# Altium footprint library Connector_Samtec_HLE_SMD.PcbLib: 290 footprints (part 9 of 24) (continued)
## Samtec_HLE-125-02-xxx-DV-BE-A_2x25_P2.54mm_Horizontal [mm]
pads (102):
  rect 1.27x1.68 smd: 1(-30.48,2.72) 2(-30.48,-2.72) 3(-27.94,2.72) 4(-27.94,-2.72) 5(-25.4,2.72) 6(-25.4,-2.72) 7(-22.86,2.72) 8(-22.86,-2.72) 9(-20.32,2.72) 10(-20.32,-2.72) 11(-17.78,2.72) 12(-17.78,-2.72) 13(-15.24,2.72) 14(-15.24,-2.72) 15(-12.7,2.72) 16(-12.7,-2.72) 17(-10.16,2.72) 18(-10.16,-2.72) 19(-7.62,2.72) 20(-7.62,-2.72) 21(-5.08,2.72) 22(-5.08,-2.72) 23(-2.54,2.72) 24(-2.54,-2.72) 25(0,2.72) 26(0,-2.72) 27(2.54,2.72) 28(2.54,-2.72) 29(5.08,2.72) 30(5.08,-2.72) 31(7.62,2.72) 32(7.62,-2.72) 33(10.16,2.72) 34(10.16,-2.72) 35(12.7,2.72) 36(12.7,-2.72) 37(15.24,2.72) 38(15.24,-2.72) 39(17.78,2.72) 40(17.78,-2.72) 41(20.32,2.72) 42(20.32,-2.72) 43(22.86,2.72) 44(22.86,-2.72) 45(25.4,2.72) 46(25.4,-2.72) 47(27.94,2.72) 48(27.94,-2.72) 49(30.48,2.72) 50(30.48,-2.72)
  round 0.97 hole 0.97: Un1(27.94,-1.27) Un2(-25.4,-1.27) Un3(17.78,-1.27) Un4(-25.4,1.27) Un5(-10.16,1.27) Un6(30.48,1.27) Un7(27.94,1.27) Un8(-20.32,1.27) Un9(-12.7,-1.27) Un10(-5.08,1.27) Un12(2.54,-1.27) Un13(7.62,1.27) Un14(-17.78,-1.27) Un15(22.86,-1.27) Un16(30.48,-1.27) Un17(22.86,1.27) Un18(-2.54,1.27) Un19(20.32,1.27) Un20(12.7,1.27) Un22(0,1.27) Un23(-10.16,-1.27) Un24(-7.62,1.27) Un25(-12.7,1.27) Un26(10.16,1.27) Un27(-7.62,-1.27) Un28(5.08,1.27) Un29(-22.86,1.27) Un30(-5.08,-1.27) Un31(-15.24,-1.27) Un32(-27.94,1.27) Un33(25.4,-1.27) Un34(-20.32,-1.27) Un35(15.24,1.27) Un36(15.24,-1.27) Un37(20.32,-1.27) Un38(-27.94,-1.27) Un39(-2.54,-1.27) Un40(-30.48,-1.27) Un41(25.4,1.27) Un42(5.08,-1.27) Un43(-15.24,1.27) Un44(2.54,1.27) Un45(10.16,-1.27) Un46(17.78,1.27) Un47(0,-1.27) Un48(12.7,-1.27) Un49(-30.48,1.27) Un50(7.62,-1.27) Un51(-22.86,-1.27) Un52(-17.78,1.27)
  round 1.78 hole 1.78: Un11(-29.21,0) Un21(29.21,0)
F.SilkS:
  lines w0.12: -31.375,-2.65 -31.86,-2.65 -31.86,2.65 -31.375,2.65 -31.375,3.56 ; -29.585,-2.65 -28.835,-2.65 ; -29.585,2.65 -28.835,2.65 ; -27.045,-2.65 -26.295,-2.65 ; -27.045,2.65 -26.295,2.65 ; -24.505,-2.65 -23.755,-2.65 ; -24.505,2.65 -23.755,2.65 ; -21.965,-2.65 -21.215,-2.65 ; -21.965,2.65 -21.215,2.65 ; -19.425,-2.65 -18.675,-2.65 ; -19.425,2.65 -18.675,2.65 ; -16.885,-2.65 -16.135,-2.65 ; -16.885,2.65 -16.135,2.65 ; -14.345,-2.65 -13.595,-2.65 ; -14.345,2.65 -13.595,2.65 ; -11.805,-2.65 -11.055,-2.65 ; -11.805,2.65 -11.055,2.65 ; -9.265,-2.65 -8.515,-2.65 ; -9.265,2.65 -8.515,2.65 ; -6.725,-2.65 -5.975,-2.65 ; -6.725,2.65 -5.975,2.65 ; -4.185,-2.65 -3.435,-2.65 ; -4.185,2.65 -3.435,2.65 ; -1.645,-2.65 -0.895,-2.65 ; -1.645,2.65 -0.895,2.65 ; 0.895,-2.65 1.645,-2.65 ; 0.895,2.65 1.645,2.65 ; 3.435,-2.65 4.185,-2.65 ; 3.435,2.65 4.185,2.65 ; 5.975,-2.65 6.725,-2.65 ; 5.975,2.65 6.725,2.65 ; 8.515,-2.65 9.265,-2.65 ; 8.515,2.65 9.265,2.65 ; 11.055,-2.65 11.805,-2.65 ; 11.055,2.65 11.805,2.65 ; 13.595,-2.65 14.345,-2.65 ; 13.595,2.65 14.345,2.65 ; 16.135,-2.65 16.885,-2.65 ; 16.135,2.65 16.885,2.65 ; 18.675,-2.65 19.425,-2.65 ; 18.675,2.65 19.425,2.65 ; 21.215,-2.65 21.965,-2.65 ; 21.215,2.65 21.965,2.65 ; 23.755,-2.65 24.505,-2.65 ; 23.755,2.65 24.505,2.65 ; 26.295,-2.65 27.045,-2.65 ; 26.295,2.65 27.045,2.65 ; 28.835,-2.65 29.585,-2.65 ; 28.835,2.65 29.585,2.65 ; 31.375,-2.65 31.86,-2.65 31.86,2.65 31.375,2.65
F.CrtYd:
  lines w0.05: -32.25,-4.06 -32.25,4.06 32.25,4.06 32.25,-4.06 -32.25,-4.06
F.Fab:
  lines w0.1: -30.98,2.54 -30.48,1.833 -29.98,2.54 ; -31.75,-2.54 31.75,-2.54 31.75,2.54 -31.75,2.54 -31.75,-2.54
  text "'.Designator'" at -4.047,-2.68 h1

## Samtec_HLE-125-02-xxx-DV-BE-LC_2x25_P2.54mm_Horizontal [mm]
pads (102):
  rect 1.27x1.68 smd: 1(-30.48,2.72) 2(-30.48,-2.72) 3(-27.94,2.72) 4(-27.94,-2.72) 5(-25.4,2.72) 6(-25.4,-2.72) 7(-22.86,2.72) 8(-22.86,-2.72) 9(-20.32,2.72) 10(-20.32,-2.72) 11(-17.78,2.72) 12(-17.78,-2.72) 13(-15.24,2.72) 14(-15.24,-2.72) 15(-12.7,2.72) 16(-12.7,-2.72) 17(-10.16,2.72) 18(-10.16,-2.72) 19(-7.62,2.72) 20(-7.62,-2.72) 21(-5.08,2.72) 22(-5.08,-2.72) 23(-2.54,2.72) 24(-2.54,-2.72) 25(0,2.72) 26(0,-2.72) 27(2.54,2.72) 28(2.54,-2.72) 29(5.08,2.72) 30(5.08,-2.72) 31(7.62,2.72) 32(7.62,-2.72) 33(10.16,2.72) 34(10.16,-2.72) 35(12.7,2.72) 36(12.7,-2.72) 37(15.24,2.72) 38(15.24,-2.72) 39(17.78,2.72) 40(17.78,-2.72) 41(20.32,2.72) 42(20.32,-2.72) 43(22.86,2.72) 44(22.86,-2.72) 45(25.4,2.72) 46(25.4,-2.72) 47(27.94,2.72) 48(27.94,-2.72) 49(30.48,2.72) 50(30.48,-2.72)
  round 0.97 hole 0.97: Un1(2.54,1.27) Un2(-20.32,-1.27) Un3(10.16,1.27) Un4(2.54,-1.27) Un5(5.08,-1.27) Un6(-7.62,1.27) Un7(-25.4,1.27) Un8(-17.78,-1.27) Un9(7.62,-1.27) Un10(5.08,1.27) Un11(-10.16,1.27) Un12(-5.08,1.27) Un13(22.86,1.27) Un14(-27.94,1.27) Un15(15.24,1.27) Un17(25.4,1.27) Un18(-25.4,-1.27) Un19(-30.48,1.27) Un20(-15.24,-1.27) Un21(17.78,1.27) Un22(-27.94,-1.27) Un23(10.16,-1.27) Un24(-2.54,-1.27) Un25(-12.7,-1.27) Un26(0,-1.27) Un27(25.4,-1.27) Un28(12.7,1.27) Un29(30.48,-1.27) Un30(20.32,-1.27) Un31(-5.08,-1.27) Un32(-12.7,1.27) Un33(-30.48,-1.27) Un34(27.94,1.27) Un35(20.32,1.27) Un36(-10.16,-1.27) Un37(-7.62,-1.27) Un38(15.24,-1.27) Un40(-22.86,-1.27) Un41(22.86,-1.27) Un42(-17.78,1.27) Un43(30.48,1.27) Un44(12.7,-1.27) Un45(0,1.27) Un46(-20.32,1.27) Un47(-15.24,1.27) Un48(27.94,-1.27) Un49(-2.54,1.27) Un50(17.78,-1.27) Un51(7.62,1.27) Un52(-22.86,1.27)
  round 1.19 hole 1.19: Un16(-29.21,0) Un39(29.21,0)
F.SilkS:
  lines w0.12: -31.375,-2.65 -31.86,-2.65 -31.86,2.65 -31.375,2.65 -31.375,3.56 ; -29.585,-2.65 -28.835,-2.65 ; -29.585,2.65 -28.835,2.65 ; -27.045,-2.65 -26.295,-2.65 ; -27.045,2.65 -26.295,2.65 ; -24.505,-2.65 -23.755,-2.65 ; -24.505,2.65 -23.755,2.65 ; -21.965,-2.65 -21.215,-2.65 ; -21.965,2.65 -21.215,2.65 ; -19.425,-2.65 -18.675,-2.65 ; -19.425,2.65 -18.675,2.65 ; -16.885,-2.65 -16.135,-2.65 ; -16.885,2.65 -16.135,2.65 ; -14.345,-2.65 -13.595,-2.65 ; -14.345,2.65 -13.595,2.65 ; -11.805,-2.65 -11.055,-2.65 ; -11.805,2.65 -11.055,2.65 ; -9.265,-2.65 -8.515,-2.65 ; -9.265,2.65 -8.515,2.65 ; -6.725,-2.65 -5.975,-2.65 ; -6.725,2.65 -5.975,2.65 ; -4.185,-2.65 -3.435,-2.65 ; -4.185,2.65 -3.435,2.65 ; -1.645,-2.65 -0.895,-2.65 ; -1.645,2.65 -0.895,2.65 ; 0.895,-2.65 1.645,-2.65 ; 0.895,2.65 1.645,2.65 ; 3.435,-2.65 4.185,-2.65 ; 3.435,2.65 4.185,2.65 ; 5.975,-2.65 6.725,-2.65 ; 5.975,2.65 6.725,2.65 ; 8.515,-2.65 9.265,-2.65 ; 8.515,2.65 9.265,2.65 ; 11.055,-2.65 11.805,-2.65 ; 11.055,2.65 11.805,2.65 ; 13.595,-2.65 14.345,-2.65 ; 13.595,2.65 14.345,2.65 ; 16.135,-2.65 16.885,-2.65 ; 16.135,2.65 16.885,2.65 ; 18.675,-2.65 19.425,-2.65 ; 18.675,2.65 19.425,2.65 ; 21.215,-2.65 21.965,-2.65 ; 21.215,2.65 21.965,2.65 ; 23.755,-2.65 24.505,-2.65 ; 23.755,2.65 24.505,2.65 ; 26.295,-2.65 27.045,-2.65 ; 26.295,2.65 27.045,2.65 ; 28.835,-2.65 29.585,-2.65 ; 28.835,2.65 29.585,2.65 ; 31.375,-2.65 31.86,-2.65 31.86,2.65 31.375,2.65
F.CrtYd:
  lines w0.05: -32.25,-4.06 32.25,-4.06 32.25,4.06 -32.25,4.06 -32.25,-4.06
F.Fab:
  lines w0.1: -30.98,2.54 -30.48,1.833 -29.98,2.54 ; -31.75,-2.54 31.75,-2.54 31.75,2.54 -31.75,2.54 -31.75,-2.54
  text "'.Designator'" at -4.047,-2.68 h1

## Samtec_HLE-125-02-xxx-DV-BE_2x25_P2.54mm_Horizontal [mm]
pads (100):
  rect 1.27x1.68 smd: 1(-30.48,2.72) 2(-30.48,-2.72) 3(-27.94,2.72) 4(-27.94,-2.72) 5(-25.4,2.72) 6(-25.4,-2.72) 7(-22.86,2.72) 8(-22.86,-2.72) 9(-20.32,2.72) 10(-20.32,-2.72) 11(-17.78,2.72) 12(-17.78,-2.72) 13(-15.24,2.72) 14(-15.24,-2.72) 15(-12.7,2.72) 16(-12.7,-2.72) 17(-10.16,2.72) 18(-10.16,-2.72) 19(-7.62,2.72) 20(-7.62,-2.72) 21(-5.08,2.72) 22(-5.08,-2.72) 23(-2.54,2.72) 24(-2.54,-2.72) 25(0,2.72) 26(0,-2.72) 27(2.54,2.72) 28(2.54,-2.72) 29(5.08,2.72) 30(5.08,-2.72) 31(7.62,2.72) 32(7.62,-2.72) 33(10.16,2.72) 34(10.16,-2.72) 35(12.7,2.72) 36(12.7,-2.72) 37(15.24,2.72) 38(15.24,-2.72) 39(17.78,2.72) 40(17.78,-2.72) 41(20.32,2.72) 42(20.32,-2.72) 43(22.86,2.72) 44(22.86,-2.72) 45(25.4,2.72) 46(25.4,-2.72) 47(27.94,2.72) 48(27.94,-2.72) 49(30.48,2.72) 50(30.48,-2.72)
  round 0.97 hole 0.97: Un1(22.86,1.27) Un2(-25.4,1.27) Un3(5.08,1.27) Un4(27.94,1.27) Un5(-10.16,-1.27) Un6(10.16,1.27) Un7(25.4,1.27) Un8(17.78,1.27) Un9(-30.48,1.27) Un10(25.4,-1.27) Un11(-2.54,1.27) Un12(-22.86,1.27) Un13(20.32,-1.27) Un14(22.86,-1.27) Un15(-27.94,-1.27) Un16(10.16,-1.27) Un17(12.7,1.27) Un18(-15.24,-1.27) Un19(7.62,-1.27) Un20(27.94,-1.27) Un21(15.24,1.27) Un22(15.24,-1.27) Un23(2.54,-1.27) Un24(-20.32,-1.27) Un25(-5.08,1.27) Un26(-5.08,-1.27) Un27(-20.32,1.27) Un28(-2.54,-1.27) Un29(-12.7,-1.27) Un30(30.48,-1.27) Un31(-7.62,1.27) Un32(30.48,1.27) Un33(-10.16,1.27) Un34(-30.48,-1.27) Un35(17.78,-1.27) Un36(-27.94,1.27) Un37(2.54,1.27) Un38(-7.62,-1.27) Un39(20.32,1.27) Un40(-22.86,-1.27) Un41(12.7,-1.27) Un42(-17.78,1.27) Un43(-25.4,-1.27) Un44(5.08,-1.27) Un45(0,1.27) Un46(-17.78,-1.27) Un47(0,-1.27) Un48(7.62,1.27) Un49(-15.24,1.27) Un50(-12.7,1.27)
F.SilkS:
  lines w0.12: -31.375,-2.65 -31.86,-2.65 -31.86,2.65 -31.375,2.65 -31.375,3.56 ; -29.585,-2.65 -28.835,-2.65 ; -29.585,2.65 -28.835,2.65 ; -27.045,-2.65 -26.295,-2.65 ; -27.045,2.65 -26.295,2.65 ; -24.505,-2.65 -23.755,-2.65 ; -24.505,2.65 -23.755,2.65 ; -21.965,-2.65 -21.215,-2.65 ; -21.965,2.65 -21.215,2.65 ; -19.425,-2.65 -18.675,-2.65 ; -19.425,2.65 -18.675,2.65 ; -16.885,-2.65 -16.135,-2.65 ; -16.885,2.65 -16.135,2.65 ; -14.345,-2.65 -13.595,-2.65 ; -14.345,2.65 -13.595,2.65 ; -11.805,-2.65 -11.055,-2.65 ; -11.805,2.65 -11.055,2.65 ; -9.265,-2.65 -8.515,-2.65 ; -9.265,2.65 -8.515,2.65 ; -6.725,-2.65 -5.975,-2.65 ; -6.725,2.65 -5.975,2.65 ; -4.185,-2.65 -3.435,-2.65 ; -4.185,2.65 -3.435,2.65 ; -1.645,-2.65 -0.895,-2.65 ; -1.645,2.65 -0.895,2.65 ; 0.895,-2.65 1.645,-2.65 ; 0.895,2.65 1.645,2.65 ; 3.435,-2.65 4.185,-2.65 ; 3.435,2.65 4.185,2.65 ; 5.975,-2.65 6.725,-2.65 ; 5.975,2.65 6.725,2.65 ; 8.515,-2.65 9.265,-2.65 ; 8.515,2.65 9.265,2.65 ; 11.055,-2.65 11.805,-2.65 ; 11.055,2.65 11.805,2.65 ; 13.595,-2.65 14.345,-2.65 ; 13.595,2.65 14.345,2.65 ; 16.135,-2.65 16.885,-2.65 ; 16.135,2.65 16.885,2.65 ; 18.675,-2.65 19.425,-2.65 ; 18.675,2.65 19.425,2.65 ; 21.215,-2.65 21.965,-2.65 ; 21.215,2.65 21.965,2.65 ; 23.755,-2.65 24.505,-2.65 ; 23.755,2.65 24.505,2.65 ; 26.295,-2.65 27.045,-2.65 ; 26.295,2.65 27.045,2.65 ; 28.835,-2.65 29.585,-2.65 ; 28.835,2.65 29.585,2.65 ; 31.375,-2.65 31.86,-2.65 31.86,2.65 31.375,2.65
F.CrtYd:
  lines w0.05: -32.25,-4.06 -32.25,4.06 32.25,4.06 32.25,-4.06 -32.25,-4.06
F.Fab:
  lines w0.1: -30.98,2.54 -30.48,1.833 -29.98,2.54 ; -31.75,-2.54 31.75,-2.54 31.75,2.54 -31.75,2.54 -31.75,-2.54
  text "'.Designator'" at -4.047,-2.68 h1

## Samtec_HLE-125-02-xxx-DV-LC_2x25_P2.54mm_Horizontal [mm]
pads (52):
  rect 1.27x2.29 smd: 1(-30.48,2.525) 2(-30.48,-2.525) 3(-27.94,2.525) 4(-27.94,-2.525) 5(-25.4,2.525) 6(-25.4,-2.525) 7(-22.86,2.525) 8(-22.86,-2.525) 9(-20.32,2.525) 10(-20.32,-2.525) 11(-17.78,2.525) 12(-17.78,-2.525) 13(-15.24,2.525) 14(-15.24,-2.525) 15(-12.7,2.525) 16(-12.7,-2.525) 17(-10.16,2.525) 18(-10.16,-2.525) 19(-7.62,2.525) 20(-7.62,-2.525) 21(-5.08,2.525) 22(-5.08,-2.525) 23(-2.54,2.525) 24(-2.54,-2.525) 25(0,2.525) 26(0,-2.525) 27(2.54,2.525) 28(2.54,-2.525) 29(5.08,2.525) 30(5.08,-2.525) 31(7.62,2.525) 32(7.62,-2.525) 33(10.16,2.525) 34(10.16,-2.525) 35(12.7,2.525) 36(12.7,-2.525) 37(15.24,2.525) 38(15.24,-2.525) 39(17.78,2.525) 40(17.78,-2.525) 41(20.32,2.525) 42(20.32,-2.525) 43(22.86,2.525) 44(22.86,-2.525) 45(25.4,2.525) 46(25.4,-2.525) 47(27.94,2.525) 48(27.94,-2.525) 49(30.48,2.525) 50(30.48,-2.525)
  round 1.19 hole 1.19: Un1(-29.21,0) Un2(29.21,0)
F.SilkS:
  lines w0.12: -31.375,-2.65 -31.86,-2.65 -31.86,2.65 -31.375,2.65 -31.375,3.67 ; -29.585,-2.65 -28.835,-2.65 ; -29.585,2.65 -28.835,2.65 ; -27.045,-2.65 -26.295,-2.65 ; -27.045,2.65 -26.295,2.65 ; -24.505,-2.65 -23.755,-2.65 ; -24.505,2.65 -23.755,2.65 ; -21.965,-2.65 -21.215,-2.65 ; -21.965,2.65 -21.215,2.65 ; -19.425,-2.65 -18.675,-2.65 ; -19.425,2.65 -18.675,2.65 ; -16.885,-2.65 -16.135,-2.65 ; -16.885,2.65 -16.135,2.65 ; -14.345,-2.65 -13.595,-2.65 ; -14.345,2.65 -13.595,2.65 ; -11.805,-2.65 -11.055,-2.65 ; -11.805,2.65 -11.055,2.65 ; -9.265,-2.65 -8.515,-2.65 ; -9.265,2.65 -8.515,2.65 ; -6.725,-2.65 -5.975,-2.65 ; -6.725,2.65 -5.975,2.65 ; -4.185,-2.65 -3.435,-2.65 ; -4.185,2.65 -3.435,2.65 ; -1.645,-2.65 -0.895,-2.65 ; -1.645,2.65 -0.895,2.65 ; 0.895,-2.65 1.645,-2.65 ; 0.895,2.65 1.645,2.65 ; 3.435,-2.65 4.185,-2.65 ; 3.435,2.65 4.185,2.65 ; 5.975,-2.65 6.725,-2.65 ; 5.975,2.65 6.725,2.65 ; 8.515,-2.65 9.265,-2.65 ; 8.515,2.65 9.265,2.65 ; 11.055,-2.65 11.805,-2.65 ; 11.055,2.65 11.805,2.65 ; 13.595,-2.65 14.345,-2.65 ; 13.595,2.65 14.345,2.65 ; 16.135,-2.65 16.885,-2.65 ; 16.135,2.65 16.885,2.65 ; 18.675,-2.65 19.425,-2.65 ; 18.675,2.65 19.425,2.65 ; 21.215,-2.65 21.965,-2.65 ; 21.215,2.65 21.965,2.65 ; 23.755,-2.65 24.505,-2.65 ; 23.755,2.65 24.505,2.65 ; 26.295,-2.65 27.045,-2.65 ; 26.295,2.65 27.045,2.65 ; 28.835,-2.65 29.585,-2.65 ; 28.835,2.65 29.585,2.65 ; 31.375,-2.65 31.86,-2.65 31.86,2.65 31.375,2.65
F.CrtYd:
  lines w0.05: -32.25,-4.17 32.25,-4.17 32.25,4.17 -32.25,4.17 -32.25,-4.17
F.Fab:
  lines w0.1: -30.98,2.54 -30.48,1.833 -29.98,2.54 ; -31.75,-2.54 -31.75,2.54 31.75,2.54 31.75,-2.54 -31.75,-2.54
  text "'.Designator'" at -4.047,-2.68 h1

## Samtec_HLE-125-02-xxx-DV_2x25_P2.54mm_Horizontal [mm]
pads (50):
  rect 1.27x2.29 smd: 1(-30.48,2.525) 2(-30.48,-2.525) 3(-27.94,2.525) 4(-27.94,-2.525) 5(-25.4,2.525) 6(-25.4,-2.525) 7(-22.86,2.525) 8(-22.86,-2.525) 9(-20.32,2.525) 10(-20.32,-2.525) 11(-17.78,2.525) 12(-17.78,-2.525) 13(-15.24,2.525) 14(-15.24,-2.525) 15(-12.7,2.525) 16(-12.7,-2.525) 17(-10.16,2.525) 18(-10.16,-2.525) 19(-7.62,2.525) 20(-7.62,-2.525) 21(-5.08,2.525) 22(-5.08,-2.525) 23(-2.54,2.525) 24(-2.54,-2.525) 25(0,2.525) 26(0,-2.525) 27(2.54,2.525) 28(2.54,-2.525) 29(5.08,2.525) 30(5.08,-2.525) 31(7.62,2.525) 32(7.62,-2.525) 33(10.16,2.525) 34(10.16,-2.525) 35(12.7,2.525) 36(12.7,-2.525) 37(15.24,2.525) 38(15.24,-2.525) 39(17.78,2.525) 40(17.78,-2.525) 41(20.32,2.525) 42(20.32,-2.525) 43(22.86,2.525) 44(22.86,-2.525) 45(25.4,2.525) 46(25.4,-2.525) 47(27.94,2.525) 48(27.94,-2.525) 49(30.48,2.525) 50(30.48,-2.525)
F.SilkS:
  lines w0.12: -31.375,-2.65 -31.86,-2.65 -31.86,2.65 -31.375,2.65 -31.375,3.67 ; -29.585,-2.65 -28.835,-2.65 ; -29.585,2.65 -28.835,2.65 ; -27.045,-2.65 -26.295,-2.65 ; -27.045,2.65 -26.295,2.65 ; -24.505,-2.65 -23.755,-2.65 ; -24.505,2.65 -23.755,2.65 ; -21.965,-2.65 -21.215,-2.65 ; -21.965,2.65 -21.215,2.65 ; -19.425,-2.65 -18.675,-2.65 ; -19.425,2.65 -18.675,2.65 ; -16.885,-2.65 -16.135,-2.65 ; -16.885,2.65 -16.135,2.65 ; -14.345,-2.65 -13.595,-2.65 ; -14.345,2.65 -13.595,2.65 ; -11.805,-2.65 -11.055,-2.65 ; -11.805,2.65 -11.055,2.65 ; -9.265,-2.65 -8.515,-2.65 ; -9.265,2.65 -8.515,2.65 ; -6.725,-2.65 -5.975,-2.65 ; -6.725,2.65 -5.975,2.65 ; -4.185,-2.65 -3.435,-2.65 ; -4.185,2.65 -3.435,2.65 ; -1.645,-2.65 -0.895,-2.65 ; -1.645,2.65 -0.895,2.65 ; 0.895,-2.65 1.645,-2.65 ; 0.895,2.65 1.645,2.65 ; 3.435,-2.65 4.185,-2.65 ; 3.435,2.65 4.185,2.65 ; 5.975,-2.65 6.725,-2.65 ; 5.975,2.65 6.725,2.65 ; 8.515,-2.65 9.265,-2.65 ; 8.515,2.65 9.265,2.65 ; 11.055,-2.65 11.805,-2.65 ; 11.055,2.65 11.805,2.65 ; 13.595,-2.65 14.345,-2.65 ; 13.595,2.65 14.345,2.65 ; 16.135,-2.65 16.885,-2.65 ; 16.135,2.65 16.885,2.65 ; 18.675,-2.65 19.425,-2.65 ; 18.675,2.65 19.425,2.65 ; 21.215,-2.65 21.965,-2.65 ; 21.215,2.65 21.965,2.65 ; 23.755,-2.65 24.505,-2.65 ; 23.755,2.65 24.505,2.65 ; 26.295,-2.65 27.045,-2.65 ; 26.295,2.65 27.045,2.65 ; 28.835,-2.65 29.585,-2.65 ; 28.835,2.65 29.585,2.65 ; 31.375,-2.65 31.86,-2.65 31.86,2.65 31.375,2.65
F.CrtYd:
  lines w0.05: -32.25,-4.17 32.25,-4.17 32.25,4.17 -32.25,4.17 -32.25,-4.17
F.Fab:
  lines w0.1: -30.98,2.54 -30.48,1.833 -29.98,2.54 ; -31.75,-2.54 -31.75,2.54 31.75,2.54 31.75,-2.54 -31.75,-2.54
  text "'.Designator'" at -4.047,-2.68 h1

## Samtec_HLE-126-02-xxx-DV-A_2x26_P2.54mm_Horizontal [mm]
pads (54):
  rect 1.27x2.29 smd: 1(-31.75,2.525) 2(-31.75,-2.525) 3(-29.21,2.525) 4(-29.21,-2.525) 5(-26.67,2.525) 6(-26.67,-2.525) 7(-24.13,2.525) 8(-24.13,-2.525) 9(-21.59,2.525) 10(-21.59,-2.525) 11(-19.05,2.525) 12(-19.05,-2.525) 13(-16.51,2.525) 14(-16.51,-2.525) 15(-13.97,2.525) 16(-13.97,-2.525) 17(-11.43,2.525) 18(-11.43,-2.525) 19(-8.89,2.525) 20(-8.89,-2.525) 21(-6.35,2.525) 22(-6.35,-2.525) 23(-3.81,2.525) 24(-3.81,-2.525) 25(-1.27,2.525) 26(-1.27,-2.525) 27(1.27,2.525) 28(1.27,-2.525) 29(3.81,2.525) 30(3.81,-2.525) 31(6.35,2.525) 32(6.35,-2.525) 33(8.89,2.525) 34(8.89,-2.525) 35(11.43,2.525) 36(11.43,-2.525) 37(13.97,2.525) 38(13.97,-2.525) 39(16.51,2.525) 40(16.51,-2.525) 41(19.05,2.525) 42(19.05,-2.525) 43(21.59,2.525) 44(21.59,-2.525) 45(24.13,2.525) 46(24.13,-2.525) 47(26.67,2.525) 48(26.67,-2.525) 49(29.21,2.525) 50(29.21,-2.525) 51(31.75,2.525) 52(31.75,-2.525)
  round 1.78 hole 1.78: Un1(-30.48,0) Un2(30.48,0)
F.SilkS:
  lines w0.12: -32.645,-2.65 -33.13,-2.65 -33.13,2.65 -32.645,2.65 -32.645,3.67 ; -30.855,-2.65 -30.105,-2.65 ; -30.855,2.65 -30.105,2.65 ; -28.315,-2.65 -27.565,-2.65 ; -28.315,2.65 -27.565,2.65 ; -25.775,-2.65 -25.025,-2.65 ; -25.775,2.65 -25.025,2.65 ; -23.235,-2.65 -22.485,-2.65 ; -23.235,2.65 -22.485,2.65 ; -20.695,-2.65 -19.945,-2.65 ; -20.695,2.65 -19.945,2.65 ; -18.155,-2.65 -17.405,-2.65 ; -18.155,2.65 -17.405,2.65 ; -15.615,-2.65 -14.865,-2.65 ; -15.615,2.65 -14.865,2.65 ; -13.075,-2.65 -12.325,-2.65 ; -13.075,2.65 -12.325,2.65 ; -10.535,-2.65 -9.785,-2.65 ; -10.535,2.65 -9.785,2.65 ; -7.995,-2.65 -7.245,-2.65 ; -7.995,2.65 -7.245,2.65 ; -5.455,-2.65 -4.705,-2.65 ; -5.455,2.65 -4.705,2.65 ; -2.915,-2.65 -2.165,-2.65 ; -2.915,2.65 -2.165,2.65 ; -0.375,-2.65 0.375,-2.65 ; -0.375,2.65 0.375,2.65 ; 2.165,-2.65 2.915,-2.65 ; 2.165,2.65 2.915,2.65 ; 4.705,-2.65 5.455,-2.65 ; 4.705,2.65 5.455,2.65 ; 7.245,-2.65 7.995,-2.65 ; 7.245,2.65 7.995,2.65 ; 9.785,-2.65 10.535,-2.65 ; 9.785,2.65 10.535,2.65 ; 12.325,-2.65 13.075,-2.65 ; 12.325,2.65 13.075,2.65 ; 14.865,-2.65 15.615,-2.65 ; 14.865,2.65 15.615,2.65 ; 17.405,-2.65 18.155,-2.65 ; 17.405,2.65 18.155,2.65 ; 19.945,-2.65 20.695,-2.65 ; 19.945,2.65 20.695,2.65 ; 22.485,-2.65 23.235,-2.65 ; 22.485,2.65 23.235,2.65 ; 25.025,-2.65 25.775,-2.65 ; 25.025,2.65 25.775,2.65 ; 27.565,-2.65 28.315,-2.65 ; 27.565,2.65 28.315,2.65 ; 30.105,-2.65 30.855,-2.65 ; 30.105,2.65 30.855,2.65 ; 32.645,-2.65 33.13,-2.65 33.13,2.65 32.645,2.65
F.CrtYd:
  lines w0.05: -33.52,-4.17 -33.52,4.17 33.52,4.17 33.52,-4.17 -33.52,-4.17
F.Fab:
  lines w0.1: -32.25,2.54 -31.75,1.833 -31.25,2.54 ; -33.02,-2.54 33.02,-2.54 33.02,2.54 -33.02,2.54 -33.02,-2.54
  text "'.Designator'" at -4.047,-2.68 h1

## Samtec_HLE-126-02-xxx-DV-BE-A_2x26_P2.54mm_Horizontal [mm]
pads (106):
  rect 1.27x1.68 smd: 1(-31.75,2.72) 2(-31.75,-2.72) 3(-29.21,2.72) 4(-29.21,-2.72) 5(-26.67,2.72) 6(-26.67,-2.72) 7(-24.13,2.72) 8(-24.13,-2.72) 9(-21.59,2.72) 10(-21.59,-2.72) 11(-19.05,2.72) 12(-19.05,-2.72) 13(-16.51,2.72) 14(-16.51,-2.72) 15(-13.97,2.72) 16(-13.97,-2.72) 17(-11.43,2.72) 18(-11.43,-2.72) 19(-8.89,2.72) 20(-8.89,-2.72) 21(-6.35,2.72) 22(-6.35,-2.72) 23(-3.81,2.72) 24(-3.81,-2.72) 25(-1.27,2.72) 26(-1.27,-2.72) 27(1.27,2.72) 28(1.27,-2.72) 29(3.81,2.72) 30(3.81,-2.72) 31(6.35,2.72) 32(6.35,-2.72) 33(8.89,2.72) 34(8.89,-2.72) 35(11.43,2.72) 36(11.43,-2.72) 37(13.97,2.72) 38(13.97,-2.72) 39(16.51,2.72) 40(16.51,-2.72) 41(19.05,2.72) 42(19.05,-2.72) 43(21.59,2.72) 44(21.59,-2.72) 45(24.13,2.72) 46(24.13,-2.72) 47(26.67,2.72) 48(26.67,-2.72) 49(29.21,2.72) 50(29.21,-2.72) 51(31.75,2.72) 52(31.75,-2.72)
  round 0.97 hole 0.97: Un1(-6.35,-1.27) Un2(6.35,-1.27) Un3(-16.51,-1.27) Un4(-13.97,1.27) Un5(1.27,1.27) Un6(13.97,1.27) Un7(-8.89,-1.27) Un8(-3.81,-1.27) Un9(3.81,-1.27) Un12(-16.51,1.27) Un13(31.75,1.27) Un14(-13.97,-1.27) Un15(-6.35,1.27) Un16(-3.81,1.27) Un17(-21.59,1.27) Un18(-24.13,1.27) Un19(-1.27,1.27) Un20(-19.05,1.27) Un21(29.21,1.27) Un22(1.27,-1.27) Un23(3.81,1.27) Un24(-19.05,-1.27) Un25(-31.75,-1.27) Un26(-29.21,-1.27) Un27(-8.89,1.27) Un28(19.05,-1.27) Un29(-11.43,1.27) Un30(26.67,-1.27) Un31(13.97,-1.27) Un32(-26.67,1.27) Un33(-1.27,-1.27) Un34(-26.67,-1.27) Un35(21.59,-1.27) Un36(31.75,-1.27) Un37(-11.43,-1.27) Un38(-31.75,1.27) Un39(16.51,1.27) Un40(29.21,-1.27) Un41(21.59,1.27) Un42(16.51,-1.27) Un43(24.13,-1.27) Un44(11.43,-1.27) Un45(6.35,1.27) Un46(8.89,-1.27) Un47(-21.59,-1.27) Un48(26.67,1.27) Un49(-24.13,-1.27) Un50(24.13,1.27) Un51(19.05,1.27) Un52(8.89,1.27) Un53(-29.21,1.27) Un54(11.43,1.27)
  round 1.78 hole 1.78: Un10(-30.48,0) Un11(30.48,0)
F.SilkS:
  lines w0.12: -32.645,-2.65 -33.13,-2.65 -33.13,2.65 -32.645,2.65 -32.645,3.56 ; -30.855,-2.65 -30.105,-2.65 ; -30.855,2.65 -30.105,2.65 ; -28.315,-2.65 -27.565,-2.65 ; -28.315,2.65 -27.565,2.65 ; -25.775,-2.65 -25.025,-2.65 ; -25.775,2.65 -25.025,2.65 ; -23.235,-2.65 -22.485,-2.65 ; -23.235,2.65 -22.485,2.65 ; -20.695,-2.65 -19.945,-2.65 ; -20.695,2.65 -19.945,2.65 ; -18.155,-2.65 -17.405,-2.65 ; -18.155,2.65 -17.405,2.65 ; -15.615,-2.65 -14.865,-2.65 ; -15.615,2.65 -14.865,2.65 ; -13.075,-2.65 -12.325,-2.65 ; -13.075,2.65 -12.325,2.65 ; -10.535,-2.65 -9.785,-2.65 ; -10.535,2.65 -9.785,2.65 ; -7.995,-2.65 -7.245,-2.65 ; -7.995,2.65 -7.245,2.65 ; -5.455,-2.65 -4.705,-2.65 ; -5.455,2.65 -4.705,2.65 ; -2.915,-2.65 -2.165,-2.65 ; -2.915,2.65 -2.165,2.65 ; -0.375,-2.65 0.375,-2.65 ; -0.375,2.65 0.375,2.65 ; 2.165,-2.65 2.915,-2.65 ; 2.165,2.65 2.915,2.65 ; 4.705,-2.65 5.455,-2.65 ; 4.705,2.65 5.455,2.65 ; 7.245,-2.65 7.995,-2.65 ; 7.245,2.65 7.995,2.65 ; 9.785,-2.65 10.535,-2.65 ; 9.785,2.65 10.535,2.65 ; 12.325,-2.65 13.075,-2.65 ; 12.325,2.65 13.075,2.65 ; 14.865,-2.65 15.615,-2.65 ; 14.865,2.65 15.615,2.65 ; 17.405,-2.65 18.155,-2.65 ; 17.405,2.65 18.155,2.65 ; 19.945,-2.65 20.695,-2.65 ; 19.945,2.65 20.695,2.65 ; 22.485,-2.65 23.235,-2.65 ; 22.485,2.65 23.235,2.65 ; 25.025,-2.65 25.775,-2.65 ; 25.025,2.65 25.775,2.65 ; 27.565,-2.65 28.315,-2.65 ; 27.565,2.65 28.315,2.65 ; 30.105,-2.65 30.855,-2.65 ; 30.105,2.65 30.855,2.65 ; 32.645,-2.65 33.13,-2.65 33.13,2.65 32.645,2.65
F.CrtYd:
  lines w0.05: -33.52,-4.06 33.52,-4.06 33.52,4.06 -33.52,4.06 -33.52,-4.06
F.Fab:
  lines w0.1: -32.25,2.54 -31.75,1.833 -31.25,2.54 ; -33.02,-2.54 33.02,-2.54 33.02,2.54 -33.02,2.54 -33.02,-2.54
  text "'.Designator'" at -4.047,-2.68 h1

## Samtec_HLE-126-02-xxx-DV-BE-LC_2x26_P2.54mm_Horizontal [mm]
pads (106):
  rect 1.27x1.68 smd: 1(-31.75,2.72) 2(-31.75,-2.72) 3(-29.21,2.72) 4(-29.21,-2.72) 5(-26.67,2.72) 6(-26.67,-2.72) 7(-24.13,2.72) 8(-24.13,-2.72) 9(-21.59,2.72) 10(-21.59,-2.72) 11(-19.05,2.72) 12(-19.05,-2.72) 13(-16.51,2.72) 14(-16.51,-2.72) 15(-13.97,2.72) 16(-13.97,-2.72) 17(-11.43,2.72) 18(-11.43,-2.72) 19(-8.89,2.72) 20(-8.89,-2.72) 21(-6.35,2.72) 22(-6.35,-2.72) 23(-3.81,2.72) 24(-3.81,-2.72) 25(-1.27,2.72) 26(-1.27,-2.72) 27(1.27,2.72) 28(1.27,-2.72) 29(3.81,2.72) 30(3.81,-2.72) 31(6.35,2.72) 32(6.35,-2.72) 33(8.89,2.72) 34(8.89,-2.72) 35(11.43,2.72) 36(11.43,-2.72) 37(13.97,2.72) 38(13.97,-2.72) 39(16.51,2.72) 40(16.51,-2.72) 41(19.05,2.72) 42(19.05,-2.72) 43(21.59,2.72) 44(21.59,-2.72) 45(24.13,2.72) 46(24.13,-2.72) 47(26.67,2.72) 48(26.67,-2.72) 49(29.21,2.72) 50(29.21,-2.72) 51(31.75,2.72) 52(31.75,-2.72)
  round 0.97 hole 0.97: Un1(-8.89,1.27) Un2(-29.21,1.27) Un4(-24.13,-1.27) Un5(-21.59,-1.27) Un6(-16.51,-1.27) Un7(-13.97,1.27) Un8(21.59,-1.27) Un9(-26.67,-1.27) Un10(26.67,1.27) Un11(24.13,-1.27) Un12(13.97,1.27) Un13(-13.97,-1.27) Un14(19.05,-1.27) Un15(-21.59,1.27) Un16(13.97,-1.27) Un17(21.59,1.27) Un18(16.51,1.27) Un19(-6.35,-1.27) Un20(24.13,1.27) Un21(29.21,1.27) Un22(3.81,1.27) Un24(-24.13,1.27) Un25(8.89,-1.27) Un26(11.43,-1.27) Un27(-19.05,1.27) Un28(-1.27,1.27) Un29(-11.43,-1.27) Un30(8.89,1.27) Un31(-29.21,-1.27) Un32(1.27,1.27) Un33(-16.51,1.27) Un34(26.67,-1.27) Un35(16.51,-1.27) Un36(31.75,1.27) Un37(1.27,-1.27) Un38(3.81,-1.27) Un39(-8.89,-1.27) Un40(-1.27,-1.27) Un41(-3.81,-1.27) Un42(-31.75,-1.27) Un43(29.21,-1.27) Un44(11.43,1.27) Un45(-26.67,1.27) Un46(6.35,-1.27) Un47(-6.35,1.27) Un48(31.75,-1.27) Un49(6.35,1.27) Un50(-11.43,1.27) Un51(-3.81,1.27) Un52(-19.05,-1.27) Un53(19.05,1.27) Un54(-31.75,1.27)
  round 1.19 hole 1.19: Un3(-30.48,0) Un23(30.48,0)
F.SilkS:
  lines w0.12: -32.645,-2.65 -33.13,-2.65 -33.13,2.65 -32.645,2.65 -32.645,3.56 ; -30.855,-2.65 -30.105,-2.65 ; -30.855,2.65 -30.105,2.65 ; -28.315,-2.65 -27.565,-2.65 ; -28.315,2.65 -27.565,2.65 ; -25.775,-2.65 -25.025,-2.65 ; -25.775,2.65 -25.025,2.65 ; -23.235,-2.65 -22.485,-2.65 ; -23.235,2.65 -22.485,2.65 ; -20.695,-2.65 -19.945,-2.65 ; -20.695,2.65 -19.945,2.65 ; -18.155,-2.65 -17.405,-2.65 ; -18.155,2.65 -17.405,2.65 ; -15.615,-2.65 -14.865,-2.65 ; -15.615,2.65 -14.865,2.65 ; -13.075,-2.65 -12.325,-2.65 ; -13.075,2.65 -12.325,2.65 ; -10.535,-2.65 -9.785,-2.65 ; -10.535,2.65 -9.785,2.65 ; -7.995,-2.65 -7.245,-2.65 ; -7.995,2.65 -7.245,2.65 ; -5.455,-2.65 -4.705,-2.65 ; -5.455,2.65 -4.705,2.65 ; -2.915,-2.65 -2.165,-2.65 ; -2.915,2.65 -2.165,2.65 ; -0.375,-2.65 0.375,-2.65 ; -0.375,2.65 0.375,2.65 ; 2.165,-2.65 2.915,-2.65 ; 2.165,2.65 2.915,2.65 ; 4.705,-2.65 5.455,-2.65 ; 4.705,2.65 5.455,2.65 ; 7.245,-2.65 7.995,-2.65 ; 7.245,2.65 7.995,2.65 ; 9.785,-2.65 10.535,-2.65 ; 9.785,2.65 10.535,2.65 ; 12.325,-2.65 13.075,-2.65 ; 12.325,2.65 13.075,2.65 ; 14.865,-2.65 15.615,-2.65 ; 14.865,2.65 15.615,2.65 ; 17.405,-2.65 18.155,-2.65 ; 17.405,2.65 18.155,2.65 ; 19.945,-2.65 20.695,-2.65 ; 19.945,2.65 20.695,2.65 ; 22.485,-2.65 23.235,-2.65 ; 22.485,2.65 23.235,2.65 ; 25.025,-2.65 25.775,-2.65 ; 25.025,2.65 25.775,2.65 ; 27.565,-2.65 28.315,-2.65 ; 27.565,2.65 28.315,2.65 ; 30.105,-2.65 30.855,-2.65 ; 30.105,2.65 30.855,2.65 ; 32.645,-2.65 33.13,-2.65 33.13,2.65 32.645,2.65
F.CrtYd:
  lines w0.05: -33.52,-4.06 33.52,-4.06 33.52,4.06 -33.52,4.06 -33.52,-4.06
F.Fab:
  lines w0.1: -32.25,2.54 -31.75,1.833 -31.25,2.54 ; -33.02,-2.54 33.02,-2.54 33.02,2.54 -33.02,2.54 -33.02,-2.54
  text "'.Designator'" at -4.047,-2.68 h1